# Altium footprint library Elettronica FM.PcbLib: 387 footprints (part 5 of 25)
Each footprint in its own frame and in the unit in brackets; x right, y up, seen from the top. Pads: shape width x height; smd on the part's side, far side on the other; paste and mask are expansions set on the pad; w line width, h text height; cw(c..) or ccw(c..) is an arc to the next point about the centre after c.
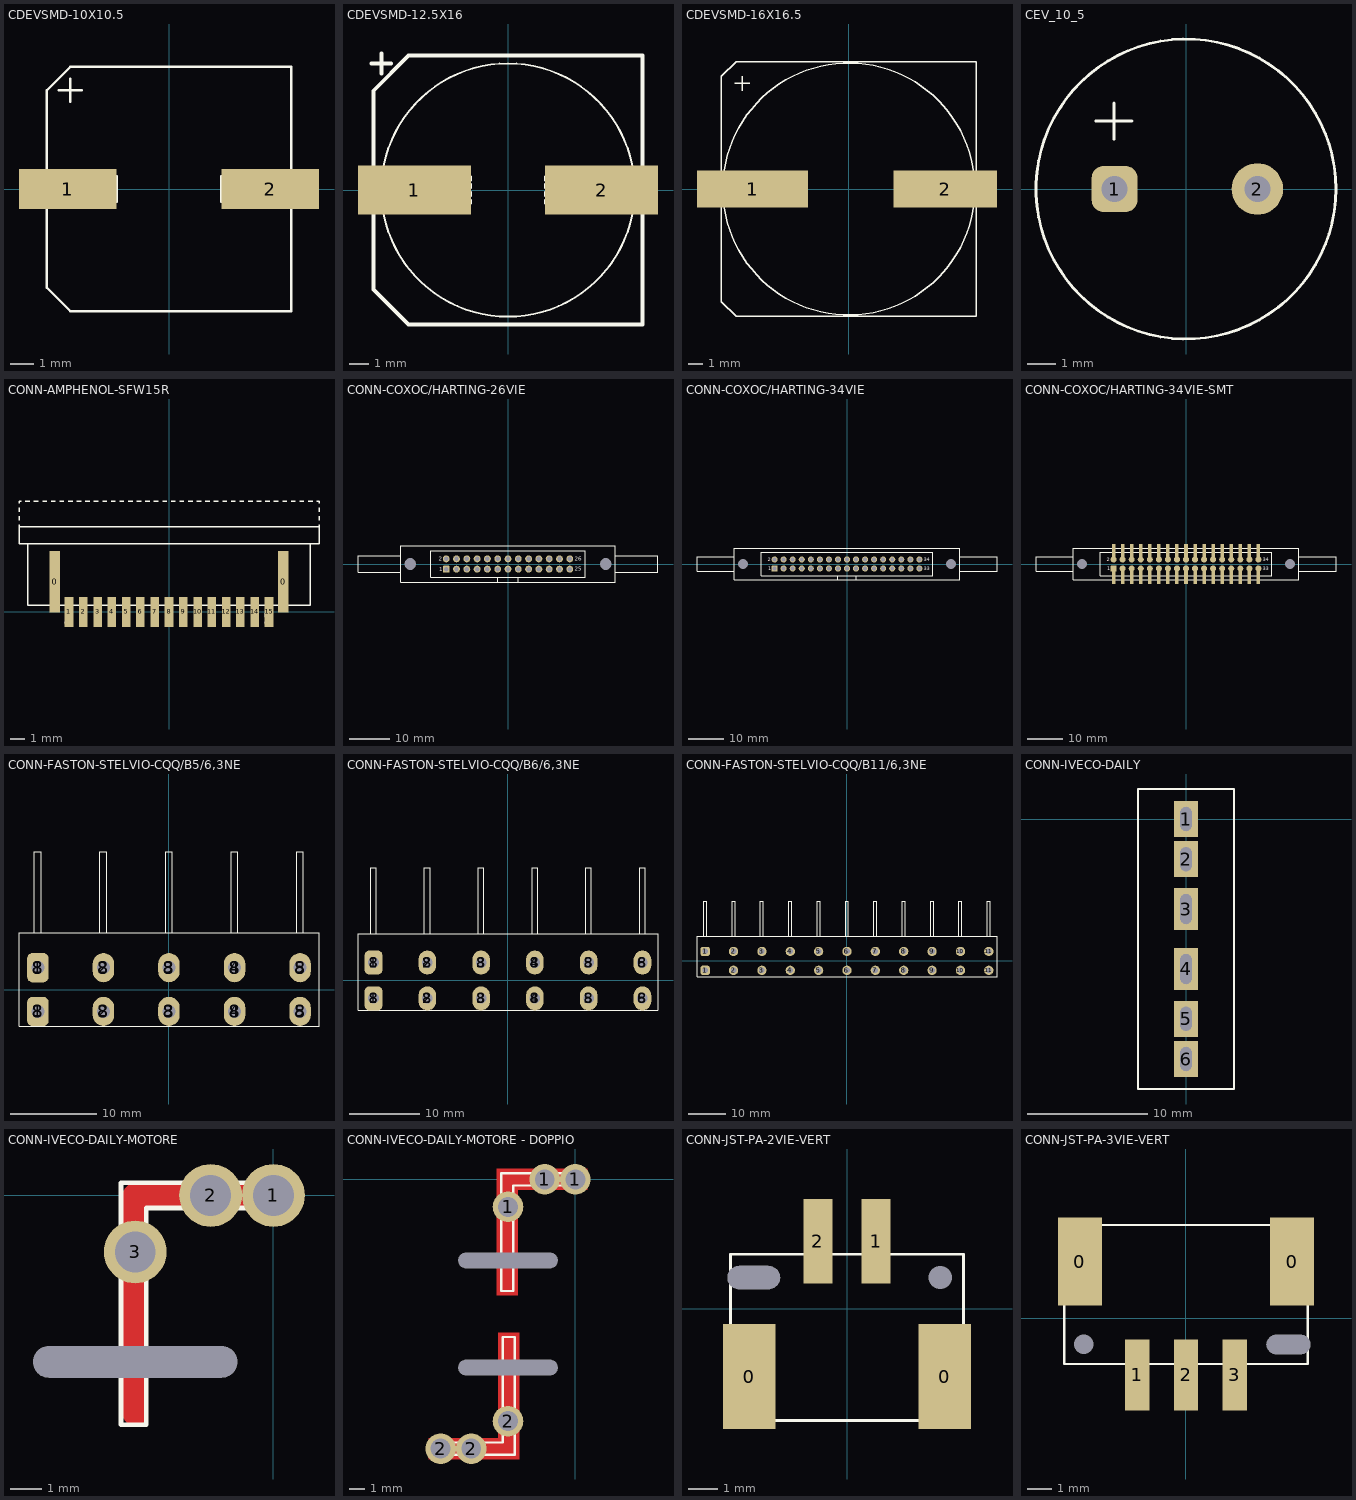
[diagram p4: the footprints below, top view; thin cyan lines are the x and y axes]

## CDEVSMD-10X10.5 [mm]
height 16.6
pads (2):
  rect 4.2x1.7 smd: 1(-4.35,0) 2(4.35,0)
Top Overlay:
  lines w0.1: -4.75,4.25 -4.25,4.25 ; -4.25,3.75 -4.25,4.25 ; -4.25,4.75 -4.25,4.25 ; -3.75,4.25 -4.25,4.25 ; -5.25,-4.25 -5.25,-0.55 -2.25,-0.55 -2.25,0.55 -5.25,0.55 -5.25,4.25 -4.25,5.25 5.25,5.25 5.25,0.55 2.25,0.55 2.25,-0.55 5.25,-0.55 5.25,-5.25 -4.25,-5.25 -5.25,-4.25
3D body "CDEVSMD-10x10.5.stp": height 10.5, standoff 0, extent -5.486,-5.131 5.514,5.169

## CDEVSMD-12.5X16 [mm]
pads (2):
  rect 5.8x2.5 smd: 1(-4.8,0) 2(4.8,0)
Top Overlay:
  circle w0.1: c0,0 r6.5
  lines w0.1: -6.7,-0.7 -6.9,-0.7 -7.4,-0.7 -7.4,0.7 -6.9,0.7 -6.7,0.7 ; -6.5,-0.7 -6.3,-0.7 ; -6.5,0.7 -6.3,0.7 ; -6.1,-0.7 -5.9,-0.7 ; -6.1,0.7 -5.9,0.7 ; -5.7,-0.7 -5.5,-0.7 ; -5.7,0.7 -5.5,0.7 ; -5.3,-0.7 -5.1,-0.7 ; -5.3,0.7 -5.1,0.7 ; -4.9,-0.7 -4.7,-0.7 ; -4.9,0.7 -4.7,0.7 ; -4.5,-0.7 -4.3,-0.7 ; -4.5,0.7 -4.3,0.7 ; -4.1,-0.7 -3.9,-0.7 ; -4.1,0.7 -3.9,0.7 ; -3.7,-0.7 -3.5,-0.7 ; -3.7,0.7 -3.5,0.7 ; -3.3,-0.7 -3.1,-0.7 ; -3.3,0.7 -3.1,0.7 ; -2.9,-0.7 -2.7,-0.7 ; -2.9,0.7 -2.7,0.7 ; -2.5,-0.7 -2.3,-0.7 ; -2.5,0.7 -2.3,0.7 ; -2.1,-0.7 -1.9,-0.7 -1.9,-0.5 ; -2.1,0.7 -1.9,0.7 -1.9,0.5 ; -1.9,-0.3 -1.9,-0.1 ; -1.9,0.1 -1.9,0.3 ; 1.9,-0.5 1.9,-0.7 2.1,-0.7 ; 1.9,-0.3 1.9,-0.1 ; 1.9,0.1 1.9,0.3 ; 1.9,0.5 1.9,0.7 2.1,0.7 ; 2.3,-0.7 2.5,-0.7 ; 2.3,0.7 2.5,0.7 ; 2.7,-0.7 2.9,-0.7 ; 2.7,0.7 2.9,0.7 ; 3.1,-0.7 3.3,-0.7 ; 3.1,0.7 3.3,0.7 ; 3.5,-0.7 3.7,-0.7 ; 3.5,0.7 3.7,0.7 ; 3.9,-0.7 4.1,-0.7 ; 3.9,0.7 4.1,0.7 ; 4.3,-0.7 4.5,-0.7 ; 4.3,0.7 4.5,0.7 ; 4.7,-0.7 4.9,-0.7 ; 4.7,0.7 4.9,0.7 ; 5.1,-0.7 5.3,-0.7 ; 5.1,0.7 5.3,0.7 ; 5.5,-0.7 5.7,-0.7 ; 5.5,0.7 5.7,0.7 ; 5.9,-0.7 6.1,-0.7 ; 5.9,0.7 6.1,0.7 ; 6.3,-0.7 6.5,-0.7 ; 6.3,0.7 6.5,0.7 ; 6.7,-0.7 6.9,-0.7 7.4,-0.7 7.4,0.7 6.9,0.7 6.7,0.7
  lines w0.2: -7.008,6.5 -5.992,6.5 ; -6.5,5.992 -6.5,7.008 ; -6.9,-5.1 -5.1,-6.9 6.9,-6.9 6.9,6.9 -5.1,6.9 -6.9,5.1 -6.9,-5.1
3D body: height 2, standoff 0, extent -6.9,-6.9 6.9,6.9
3D body: height 17, standoff 0, extent -6.5,-6.498 6.5,6.498

## CDEVSMD-16X16.5 [mm]
height 16.6
pads (2):
  rect 7.5x2.5 smd: 1(-6.5,0)
  rect 7x2.5 smd: 2(6.5,0)
Top Overlay:
  circle w0.1: c0,0 r8.5
  lines w0.1: -8.3,-0.75 -8.6,-0.75 -9.5,-0.75 -9.5,0.75 -8.6,0.75 -8.3,0.75 ; -8,-0.75 -7.7,-0.75 ; -8,0.75 -7.7,0.75 ; -7.7,7.125 -6.7,7.125 ; -7.4,-0.75 -7.1,-0.75 ; -7.4,0.75 -7.1,0.75 ; -7.2,6.625 -7.2,7.625 ; -6.8,-0.75 -6.5,-0.75 ; -6.8,0.75 -6.5,0.75 ; -6.2,-0.75 -5.9,-0.75 ; -6.2,0.75 -5.9,0.75 ; -5.6,-0.75 -5.3,-0.75 ; -5.6,0.75 -5.3,0.75 ; -5,-0.75 -4.7,-0.75 ; -5,0.75 -4.7,0.75 ; -4.4,-0.75 -4.1,-0.75 ; -4.4,0.75 -4.1,0.75 ; -3.8,-0.75 -3.35,-0.75 -3.35,-0.45 ; -3.8,0.75 -3.35,0.75 -3.35,0.45 ; -3.35,-0.15 -3.35,0.15 ; 3.35,-0.45 3.35,-0.75 3.8,-0.75 ; 3.35,-0.15 3.35,0.15 ; 3.35,0.45 3.35,0.75 3.8,0.75 ; 4.1,-0.75 4.4,-0.75 ; 4.1,0.75 4.4,0.75 ; 4.7,-0.75 5,-0.75 ; 4.7,0.75 5,0.75 ; 5.3,-0.75 5.6,-0.75 ; 5.3,0.75 5.6,0.75 ; 5.9,-0.75 6.2,-0.75 ; 5.9,0.75 6.2,0.75 ; 6.5,-0.75 6.8,-0.75 ; 6.5,0.75 6.8,0.75 ; 7.1,-0.75 7.4,-0.75 ; 7.1,0.75 7.4,0.75 ; 7.7,-0.75 8,-0.75 ; 7.7,0.75 8,0.75 ; 8.3,-0.75 8.6,-0.75 9.5,-0.75 9.5,0.75 8.6,0.75 8.3,0.75 ; -8.6,-7.6 -7.6,-8.6 8.6,-8.6 8.6,8.6 -7.6,8.6 -8.6,7.6 -8.6,-7.6
3D body: height 17, standoff 0, extent -8.25,-8.247 8.25,8.247
3D body: height 1, standoff 0, extent -8.6,-8.6 8.6,8.6

## CEV_10_5 [mm]
height 1.9
pads (2):
  rrect50% 1.6x1.6 hole 0.9: 1(-2.5,0)
  round 1.8 hole 0.9: 2(2.5,0)
Top Overlay:
  circle w0.1: c0,0 r5.25
  lines w0.1: -3.16,2.375 -1.89,2.375 ; -2.525,1.74 -2.525,3.01
3D body: height 17.5, standoff 0, extent -5.25,-5.25 5.25,5.25
3D body: height 0, standoff -3, extent -2.84,-0.299 -2.242,0.3
3D body: height 0, standoff -3, extent 2.24,-0.299 2.838,0.3

## CONN-AMPHENOL-SFW15R [mm]
pads (17):
  rect 0.75x4.3 smd mask+0.05: 0(-8,2.1) 0(8,2.1)
  rect 0.6x2.1 smd mask+0.05: 1(-7,0) 2(-6,0) 3(-5,0) 4(-4,0) 5(-3,0) 6(-2,0) 7(-1,0) 8(0,0) 9(1,0) 10(2,0) 11(3,0) 12(4,0) 13(5,0) 14(6,0) 15(7,0)
Top Overlay:
  lines w0.1: -10.5,5.8 -10.5,6.1 ; -10.5,6.4 -10.5,6.7 ; -10.5,7 -10.5,7.3 ; -10.5,7.6 -10.5,7.75 -10.35,7.75 ; -10.05,7.75 -9.75,7.75 ; -9.9,4.75 -9.9,0.45 9.9,0.45 9.9,4.75 ; -9.45,7.75 -9.15,7.75 ; -8.85,7.75 -8.55,7.75 ; -8.25,7.75 -7.95,7.75 ; -7.65,7.75 -7.35,7.75 ; -7.05,7.75 -6.75,7.75 ; -6.45,7.75 -6.15,7.75 ; -5.85,7.75 -5.55,7.75 ; -5.25,7.75 -4.95,7.75 ; -4.65,7.75 -4.35,7.75 ; -4.05,7.75 -3.75,7.75 ; -3.45,7.75 -3.15,7.75 ; -2.85,7.75 -2.55,7.75 ; -2.25,7.75 -1.95,7.75 ; -1.65,7.75 -1.35,7.75 ; -1.05,7.75 -0.75,7.75 ; -0.45,7.75 -0.15,7.75 ; 0.15,7.75 0.45,7.75 ; 0.75,7.75 1.05,7.75 ; 1.35,7.75 1.65,7.75 ; 1.95,7.75 2.25,7.75 ; 2.55,7.75 2.85,7.75 ; 3.15,7.75 3.45,7.75 ; 3.75,7.75 4.05,7.75 ; 4.35,7.75 4.65,7.75 ; 4.95,7.75 5.25,7.75 ; 5.55,7.75 5.85,7.75 ; 6.15,7.75 6.45,7.75 ; 6.75,7.75 7.05,7.75 ; 7.35,7.75 7.65,7.75 ; 7.95,7.75 8.25,7.75 ; 8.55,7.75 8.85,7.75 ; 9.15,7.75 9.45,7.75 ; 9.75,7.75 10.05,7.75 ; 10.35,7.75 10.5,7.75 10.5,7.6 ; 10.5,5.8 10.5,6.1 ; 10.5,6.4 10.5,6.7 ; 10.5,7 10.5,7.3 ; -10.5,4.75 10.5,4.75 10.5,5.95 -10.5,5.95 -10.5,4.75
  text "15" at 7.3,-1.025 h0.6
  text "1" at -6.7,-1.025 h0.6
3D body "ssfw15r_2_4st_lf.stp": height 2.7, standoff 0, extent -10.4,-0.55 10.4,5.95

## CONN-COXOC/HARTING-26VIE [mm]
pads (28):
  round 0 hole 2.85 unplated: 0(-24.13,0) 0(24.13,0)
  rrect25% 1.7x1.7 hole 1.1: 1(-15.24,-1.27)
  round 1.7 hole 1.1: 2(-15.24,1.27) 3(-12.7,-1.27) 4(-12.7,1.27) 5(-10.16,-1.27) 6(-10.16,1.27) 7(-7.62,-1.27) 8(-7.62,1.27) 9(-5.08,-1.27) 10(-5.08,1.27) 11(-2.54,-1.27) 12(-2.54,1.27) 13(0,-1.27) 14(0,1.27) 15(2.54,-1.27) 16(2.54,1.27) 17(5.08,-1.27) 18(5.08,1.27) 19(7.62,-1.27) 20(7.62,1.27) 21(10.16,-1.27) 22(10.16,1.27) 23(12.7,-1.27) 24(12.7,1.27) 25(15.24,-1.27) 26(15.24,1.27)
Top Overlay:
  lines w0.1: -26.5,-2 -37,-2 -37,2 -26.5,2 ; 26.5,-2 37,-2 37,2 26.5,2 ; -2.54,-4.45 2.54,-4.45 ; -2.54,-4.45 -26.5,-4.45 -26.5,4.45 26.5,4.45 26.5,-4.45 2.54,-4.45 ; -2.54,-4.45 -2.54,-3.302 2.54,-3.302 2.54,-4.45 ; -19.05,-3.302 -8.89,-3.302 19.05,-3.302 19.05,3.302 -19.05,3.302 -19.05,-3.302
  text "25" at 16.425,-1.725 h1
  text "26" at 16.43,0.805 h1
  text "1" at -16.96,-1.775 h1
  text "2" at -17.11,0.775 h1
3D body "091X526X904_100081399MOD000B.STP": height 25.79, standoff -2.86, extent -26.3,-4.25 26.3,4.25

## CONN-COXOC/HARTING-34VIE [mm]
pads (36):
  round 0 hole 2.85 unplated: 0(-29.21,0) 0(29.21,0)
  rrect25% 1.7x1.7 hole 1.1: 1(-20.32,-1.27)
  round 1.7 hole 1.1: 2(-20.32,1.27) 3(-17.78,-1.27) 4(-17.78,1.27) 5(-15.24,-1.27) 6(-15.24,1.27) 7(-12.7,-1.27) 8(-12.7,1.27) 9(-10.16,-1.27) 10(-10.16,1.27) 11(-7.62,-1.27) 12(-7.62,1.27) 13(-5.08,-1.27) 14(-5.08,1.27) 15(-2.54,-1.27) 16(-2.54,1.27) 17(0,-1.27) 18(0,1.27) 19(2.54,-1.27) 20(2.54,1.27) 21(5.08,-1.27) 22(5.08,1.27) 23(7.62,-1.27) 24(7.62,1.27) 25(10.16,-1.27) 26(10.16,1.27) 27(12.7,-1.27) 28(12.7,1.27) 29(15.24,-1.27) 30(15.24,1.27) 31(17.78,-1.27) 32(17.78,1.27) 33(20.32,-1.27) 34(20.32,1.27)
Top Overlay:
  lines w0.1: -31.6,-2 -42.1,-2 -42.1,2 -31.6,2 ; 31.6,-2 42.1,-2 42.1,2 31.6,2 ; -2.54,-4.45 2.54,-4.45 ; -2.54,-4.45 -31.6,-4.45 -31.6,4.45 31.6,4.45 31.6,-4.45 2.54,-4.45 ; -2.54,-4.45 -2.54,-3.302 2.54,-3.302 2.54,-4.45 ; -24.13,-3.302 -24.13,3.302 24.13,3.302 24.13,-3.302 -8.89,-3.302 -24.13,-3.302
  text "34" at 21.525,0.8 h1
  text "33" at 21.515,-1.75 h1
  text "1" at -22.04,-1.775 h1
  text "2" at -22.19,0.775 h1
3D body "091X534X904_100081405MOD000B.STP": height 25.79, standoff -2.86, extent -31.4,-4.25 31.4,4.25

## CONN-COXOC/HARTING-34VIE-SMT [mm]
pads (70):
  round 0 hole 2.9 unplated: 0(-29.17,0) 0(29.17,0)
  rect 1x4.65 smd paste+0 mask+0.1: 1(-20.32,-3.325) 2(-20.32,3.325) 3(-17.78,-3.325) 4(-17.78,3.325) 5(-15.24,-3.325) 6(-15.24,3.325) 7(-12.7,-3.325) 8(-12.7,3.325) 9(-10.16,-3.325) 10(-10.16,3.325) 11(-7.62,-3.325) 12(-7.62,3.325) 13(-5.08,-3.325) 14(-5.08,3.325) 15(-2.54,-3.325) 16(-2.54,3.325) 17(0,-3.325) 18(0,3.325) 19(2.54,-3.325) 20(2.54,3.325) 21(5.08,-3.325) 22(5.08,3.325) 23(7.62,-3.325) 24(7.62,3.325) 25(10.16,-3.325) 26(10.16,3.325) 27(12.7,-3.325) 28(12.7,3.325) 29(15.24,-3.325) 30(15.24,3.325) 31(17.78,-3.325) 32(17.78,3.325) 33(20.32,-3.325) 34(20.32,3.325)
  rrect25% 1.7x1.7 smd: 1(-20.32,-1.27)
  round 1.7 smd: 2(-20.32,1.27) 3(-17.78,-1.27) 4(-17.78,1.27) 5(-15.24,-1.27) 6(-15.24,1.27) 7(-12.7,-1.27) 8(-12.7,1.27) 9(-10.16,-1.27) 10(-10.16,1.27) 11(-7.62,-1.27) 12(-7.62,1.27) 13(-5.08,-1.27) 14(-5.08,1.27) 15(-2.54,-1.27) 16(-2.54,1.27) 17(0,-1.27) 18(0,1.27) 19(2.54,-1.27) 20(2.54,1.27) 21(5.08,-1.27) 22(5.08,1.27) 23(7.62,-1.27) 24(7.62,1.27) 25(10.16,-1.27) 26(10.16,1.27) 27(12.7,-1.27) 28(12.7,1.27) 29(15.24,-1.27) 30(15.24,1.27) 31(17.78,-1.27) 32(17.78,1.27) 33(20.32,-1.27) 34(20.32,1.27)
Top Overlay:
  lines w0.1: -31.6,-2 -42.1,-2 -42.1,2 -31.6,2 ; 31.6,-2 42.1,-2 42.1,2 31.6,2 ; -2.54,-4.45 2.54,-4.45 ; -2.54,-4.45 -31.6,-4.45 -31.6,4.45 31.6,4.45 31.6,-4.45 2.54,-4.45 ; -2.54,-4.45 -2.54,-3.302 2.54,-3.302 2.54,-4.45 ; -24.13,-3.302 -24.13,3.302 24.13,3.302 24.13,-3.302 -8.89,-3.302 -24.13,-3.302
  text "34" at 21.525,0.8 h1
  text "33" at 21.515,-1.75 h1
  text "1" at -22.04,-1.775 h1
  text "2" at -22.19,0.775 h1
3D body "091X534X904_100081405MOD000B.STP": height 25.79, standoff -2.86, extent -31.4,-4.25 31.4,4.25

## CONN-FASTON-STELVIO-CQQ/B5/6,3NE [mm]
height 1.7
pads (30):
  rrect50% 2.5x3.4 / inner rrect50% 2.2x2.2 / far side rrect50% 2.5x3 hole 1.5 mask-5: 1(-15.24,-2.54) 1(-15.24,2.54)
  oval 2.5x3.4 / inner round 2.2 / far side oval 2.5x3 hole 1.5 mask-5: 2(-7.62,-2.54) 2(-7.62,2.54) 3(0,-2.54) 3(0,2.54) 4(7.62,-2.54) 4(7.62,2.54) 5(15.24,-2.54) 5(15.24,2.54)
  round 2.7 on Top Solder mask+0.1: 8(-15.24,-2.54) 8(-15.24,2.54) 8(-7.62,-2.54) 8(-7.62,2.54) 8(0,-2.54) 8(0,2.54) 8(7.62,-2.54) 8(7.62,2.54) 8(15.24,-2.54) 8(15.24,2.54)
  rrect50% 2.7x3.2 on Bottom Solder mask+0.1: 8(-15.24,-2.54) 8(-15.24,2.54)
  oval 2.7x3.2 on Bottom Solder mask+0.1: 8(-7.62,-2.54) 8(-7.62,2.54) 8(0,-2.54) 8(0,2.54) 8(7.62,-2.54) 8(7.62,2.54) 8(15.24,-2.54) 8(15.24,2.54)
Top Overlay:
  lines w0.1: -15.64,6.6 -15.64,16 -14.84,16 -14.84,6.6 ; -8.02,6.6 -8.02,16 -7.22,16 -7.22,6.6 ; -0.4,6.6 -0.4,16 0.4,16 0.4,6.6 ; 7.22,6.6 7.22,16 8.02,16 8.02,6.6 ; 14.84,6.6 14.84,16 15.64,16 15.64,6.6 ; -17.438,-4.25 -17.438,6.6 17.443,6.6 17.443,-4.25 -17.438,-4.25
3D body: height 9.15, standoff 2.85, extent 14.84,6.6 15.64,16
3D body: height 9.15, standoff 2.85, extent 7.22,6.6 8.02,16
3D body: height 9.15, standoff 2.85, extent -0.4,6.6 0.4,16
3D body: height 9.15, standoff 2.85, extent -8.02,6.6 -7.22,16
3D body: height 0, standoff -4, extent -15.64,-3.09 -14.84,-1.99
3D body: height 0, standoff -4, extent -15.64,1.99 -14.84,3.09
3D body: height 0, standoff -4, extent -8.02,-3.09 -7.22,-1.99
3D body: height 0, standoff -4, extent -8.02,1.99 -7.22,3.09
3D body: height 0, standoff -4, extent -0.4,-3.09 0.4,-1.99
3D body: height 0, standoff -4, extent -0.4,1.99 0.4,3.09
3D body: height 0, standoff -4, extent 7.22,-3.09 8.02,-1.99
3D body: height 0, standoff -4, extent 7.22,1.99 8.02,3.09
3D body: height 0, standoff -4, extent 14.84,-3.09 15.64,-1.99
3D body: height 0, standoff -4, extent 14.84,1.99 15.64,3.09
3D body: height 9.15, standoff 2.85, extent -15.64,6.6 -14.84,16
3D body: height 11, standoff 0, extent -17.437,-4.25 17.443,6.6

## CONN-FASTON-STELVIO-CQQ/B6/6,3NE [mm]
height 1.7
pads (36):
  rrect50% 2.5x3.4 / inner rrect50% 2.2x2.2 / far side rrect50% 2.5x3 hole 1.5 mask-5: 1(-19.05,-2.54) 1(-19.05,2.54)
  oval 2.5x3.4 / inner round 2.2 / far side oval 2.5x3 hole 1.5 mask-5: 2(-11.43,-2.54) 2(-11.43,2.54) 3(-3.81,-2.54) 3(-3.81,2.54) 4(3.81,-2.54) 4(3.81,2.54) 5(11.43,-2.54) 5(11.43,2.54) 6(19.05,-2.54) 6(19.05,2.54)
  round 2.7 on Top Solder mask+0.1: 8(-19.05,-2.54) 8(-19.05,2.54) 8(-11.43,-2.54) 8(-11.43,2.54) 8(-3.81,-2.54) 8(-3.81,2.54) 8(3.81,-2.54) 8(3.81,2.54) 8(11.43,-2.54) 8(11.43,2.54) 8(19.05,-2.54) 8(19.05,2.54)
  rrect50% 2.7x3.2 on Bottom Solder mask+0.1: 8(-19.05,-2.54) 8(-19.05,2.54)
  oval 2.7x3.2 on Bottom Solder mask+0.1: 8(-11.43,-2.54) 8(-11.43,2.54) 8(-3.81,-2.54) 8(-3.81,2.54) 8(3.81,-2.54) 8(3.81,2.54) 8(11.43,-2.54) 8(11.43,2.54) 8(19.05,-2.54) 8(19.05,2.54)
Top Overlay:
  lines w0.1: -19.45,6.6 -19.45,16 -18.65,16 -18.65,6.6 ; -11.83,6.6 -11.83,16 -11.03,16 -11.03,6.6 ; -4.21,6.6 -4.21,16 -3.41,16 -3.41,6.6 ; 3.41,6.6 3.41,16 4.21,16 4.21,6.6 ; 11.03,6.6 11.03,16 11.83,16 11.83,6.6 ; 18.65,6.6 18.65,16 19.45,16 19.45,6.6 ; 21.25,-4.25 -21.248,-4.25 -21.248,6.6 21.25,6.6 ; 21.253,-4.25 21.253,6.6
3D body: height 11, standoff 0, extent -21.247,-4.25 21.25,6.6
3D body: height 9.15, standoff 2.85, extent -19.45,6.6 -18.65,16
3D body: height 0, standoff -4, extent 18.65,-3.09 19.45,-1.99
3D body: height 0, standoff -4, extent 18.65,1.99 19.45,3.09
3D body: height 0, standoff -4, extent 11.03,1.99 11.83,3.09
3D body: height 0, standoff -4, extent 11.03,-3.09 11.83,-1.99
3D body: height 0, standoff -4, extent 3.41,1.99 4.21,3.09
3D body: height 0, standoff -4, extent 3.41,-3.09 4.21,-1.99
3D body: height 0, standoff -4, extent -4.21,1.99 -3.41,3.09
3D body: height 0, standoff -4, extent -4.21,-3.09 -3.41,-1.99
3D body: height 0, standoff -4, extent -11.83,1.99 -11.03,3.09
3D body: height 0, standoff -4, extent -11.83,-3.09 -11.03,-1.99
3D body: height 0, standoff -4, extent -19.45,1.99 -18.65,3.09
3D body: height 0, standoff -4, extent -19.45,-3.09 -18.65,-1.99
3D body: height 9.15, standoff 2.85, extent -11.83,6.6 -11.03,16
3D body: height 9.15, standoff 2.85, extent -4.21,6.6 -3.41,16
3D body: height 9.15, standoff 2.85, extent 3.41,6.6 4.21,16
3D body: height 9.15, standoff 2.85, extent 11.03,6.6 11.83,16
3D body: height 9.15, standoff 2.85, extent 18.65,6.6 19.45,16

## CONN-FASTON-STELVIO-CQQ/B11/6,3NE [mm]
height 1.7
pads (22):
  rrect50% 2.5x2.5 hole 1.5: 1(-38.1,-2.54) 1(-38.1,2.54)
  round 2.5 hole 1.5: 2(-30.48,-2.54) 2(-30.48,2.54) 10(30.48,-2.54) 10(30.48,2.54) 11(38.1,-2.54) 11(38.1,2.54)
  round 2.5 / inner round 2.2 / far side round 2.5 hole 1.5: 3(-22.86,-2.54) 3(-22.86,2.54) 4(-15.24,-2.54) 4(-15.24,2.54) 5(-7.62,-2.54) 5(-7.62,2.54) 6(0,-2.54) 6(0,2.54) 7(7.62,-2.54) 7(7.62,2.54) 8(15.24,-2.54) 8(15.24,2.54) 9(22.86,-2.54) 9(22.86,2.54)
Top Overlay:
  lines w0.1: -38.5,6.6 -38.5,16 -37.7,16 -37.7,6.6 ; -30.88,6.6 -30.88,16 -30.08,16 -30.08,6.6 ; -23.26,6.6 -23.26,16 -22.46,16 -22.46,6.6 ; -15.64,6.6 -15.64,16 -14.84,16 -14.84,6.6 ; -8.02,6.6 -8.02,16 -7.22,16 -7.22,6.6 ; -0.4,6.6 -0.4,16 0.4,16 0.4,6.6 ; 7.22,6.6 7.22,16 8.02,16 8.02,6.6 ; 14.84,6.6 14.84,16 15.64,16 15.64,6.6 ; 22.46,6.6 22.46,16 23.26,16 23.26,6.6 ; 30.08,6.6 30.08,16 30.88,16 30.88,6.6 ; 37.7,6.6 37.7,16 38.5,16 38.5,6.6 ; -40.298,-4.25 -40.298,6.6 40.303,6.6 40.303,-4.25 -40.298,-4.25
3D body: height 9.15, standoff 2.85, extent 37.7,6.6 38.5,16
3D body: height 9.15, standoff 2.85, extent 30.08,6.6 30.88,16
3D body: height 9.15, standoff 2.85, extent 22.46,6.6 23.26,16
3D body: height 9.15, standoff 2.85, extent 14.84,6.6 15.64,16
3D body: height 9.15, standoff 2.85, extent 7.22,6.6 8.02,16
3D body: height 9.15, standoff 2.85, extent -0.4,6.6 0.4,16
3D body: height 9.15, standoff 2.85, extent -8.02,6.6 -7.22,16
3D body: height 9.15, standoff 2.85, extent -15.64,6.6 -14.84,16
3D body: height 9.15, standoff 2.85, extent -23.26,6.6 -22.46,16
3D body: height 9.15, standoff 2.85, extent -30.88,6.6 -30.08,16
3D body: height 0, standoff -4, extent 37.7,-3.09 38.5,-1.99
3D body: height 0, standoff -4, extent 37.7,1.99 38.5,3.09
3D body: height 0, standoff -4, extent 30.08,-3.09 30.88,-1.99
3D body: height 0, standoff -4, extent 30.08,1.99 30.88,3.09
3D body: height 0, standoff -4, extent 22.46,-3.09 23.26,-1.99
3D body: height 0, standoff -4, extent 22.46,1.99 23.26,3.09
3D body: height 0, standoff -4, extent 14.84,-3.09 15.64,-1.99
3D body: height 0, standoff -4, extent 14.84,1.99 15.64,3.09
3D body: height 0, standoff -4, extent 7.22,-3.09 8.02,-1.99
3D body: height 0, standoff -4, extent 7.22,1.99 8.02,3.09
3D body: height 0, standoff -4, extent -38.5,-3.09 -37.7,-1.99
3D body: height 0, standoff -4, extent -38.5,1.99 -37.7,3.09
3D body: height 0, standoff -4, extent -30.88,-3.09 -30.08,-1.99
3D body: height 0, standoff -4, extent -30.88,1.99 -30.08,3.09
3D body: height 0, standoff -4, extent -23.26,-3.09 -22.46,-1.99
3D body: height 0, standoff -4, extent -23.26,1.99 -22.46,3.09
3D body: height 0, standoff -4, extent -15.64,-3.09 -14.84,-1.99
3D body: height 0, standoff -4, extent -15.64,1.99 -14.84,3.09
3D body: height 0, standoff -4, extent -8.02,-3.09 -7.22,-1.99
3D body: height 0, standoff -4, extent -8.02,1.99 -7.22,3.09
3D body: height 0, standoff -4, extent -0.4,1.99 0.4,3.09
3D body: height 0, standoff -4, extent -0.4,-3.09 0.4,-1.99
3D body: height 9.15, standoff 2.85, extent -38.5,6.6 -37.7,16
3D body: height 11, standoff 0, extent -40.297,-4.25 40.303,6.6

## CONN-IVECO-DAILY [mm]
height 9
pads (6):
  rect 2x3 hole 0.95 slot 2 at 90 deg: 1(0,0) 2(0,-3.35) 5(0,-16.65) 6(0,-20)
  rect 2x3.5 hole 0.95 slot 2.5 at 90 deg: 3(0,-7.5) 4(0,-12.5)
Top Overlay:
  lines w0.152: -4,-22.5 -4,2.5 4,2.5 4,-22.5 -4,-22.5

## CONN-IVECO-DAILY-MOTORE [mm]
height 11.5
pads (4):
  round 2 hole 1.3: 1(0,0) 2(-2,0) 3(-4.4,-1.8)
  round 0 hole 1 slot 6.5 at 0 deg unplated: 4(-4.4,-5.3)
Top Layer:
  lines w0.8: -4.4,-6.94 -4.4,-0.584 ; -4.4,-1.8 -4.4,-0.07 ; -4.4,0 0,0
Top Overlay:
  lines w0.152: -7.15,-5.3 -1.65,-5.3 ; -4.85,-7.3 -4.85,0.4 0.5,0.4 0.5,-0.4 -4.05,-0.4 -4.05,-7.3 -4.85,-7.3

## CONN-IVECO-DAILY-MOTORE - DOPPIO [mm]
height 11.5
pads (8):
  round 0 hole 1 slot 6.5 at 0 deg unplated: 0(-4.4,-5.3) 0(-4.4,-12.3)
  round 2 hole 1.3: 1(-4.4,-1.8) 1(-2,0) 1(0,0) 2(-8.8,-17.6) 2(-6.8,-17.6) 2(-4.4,-15.8)
Top Layer:
  pour cut-out: -5.025,-10.025 -5.025,-16.925 -9.575,-16.925 -9.575,-18.275 -3.675,-18.275 -3.675,-10.025
  pour cut-out: -3.775,-7.575 -3.775,-0.675 0.775,-0.675 0.775,0.675 -5.125,0.675 -5.125,-7.575
Top Overlay:
  lines w0.15: -7.15,-12.3 -1.65,-12.3 ; -7.15,-5.3 -1.65,-5.3 ; -9.3,-18 -3.95,-18 -3.95,-10.3 -4.75,-10.3 -4.75,-17.2 -9.3,-17.2 -9.3,-18 ; -4.85,-7.3 -4.85,0.4 0.5,0.4 0.5,-0.4 -4.05,-0.4 -4.05,-7.3 -4.85,-7.3

## CONN-JST-PA-2VIE-VERT [mm]
height 16.6
pads (6):
  rect 1.8x3.6 smd: 0(-3.35,-2.325) 0(3.35,-2.325)
  round 0 hole 0.8 slot 1.8 at 0 deg unplated: 0(-3.2,1.075)
  round 0 hole 0.8 unplated: 0(3.2,1.075)
  rect 1x2.9 smd: 1(1,2.325) 2(-1,2.325)
Top Overlay:
  lines w0.1: -4,-3.825 4,-3.825 4,1.875 -4,1.875 -4,-3.825
3D body "BM02B-PASS-TF.STEP": height 9, standoff 0, extent -4,-3.825 4,3.275

## CONN-JST-PA-3VIE-VERT [mm]
height 16.6
pads (7):
  rect 1.8x3.6 smd: 0(-4.35,2.325) 0(4.35,2.325)
  round 0 hole 0.8 unplated: 0(-4.2,-1.075)
  round 0 hole 0.8 slot 1.8 at 0 deg unplated: 0(4.2,-1.075)
  rect 1x2.9 smd: 1(-2,-2.325) 2(0,-2.325) 3(2,-2.325)
Top Overlay:
  lines w0.1: -5,-1.875 5,-1.875 5,3.825 -5,3.825 -5,-1.875
3D body "BM03B-PASS-TF.STEP": height 9, standoff 0, extent -5,-3.275 5,3.825